# Altium footprint library PcbLib1.PcbLib: 148 footprints (part 8 of 10)
Each footprint in its own frame and in the unit in brackets; x right, y up, seen from the top. Pads: shape width x height; smd on the part's side, far side on the other; paste and mask are expansions set on the pad; w line width, h text height; cw(c..) or ccw(c..) is an arc to the next point about the centre after c.
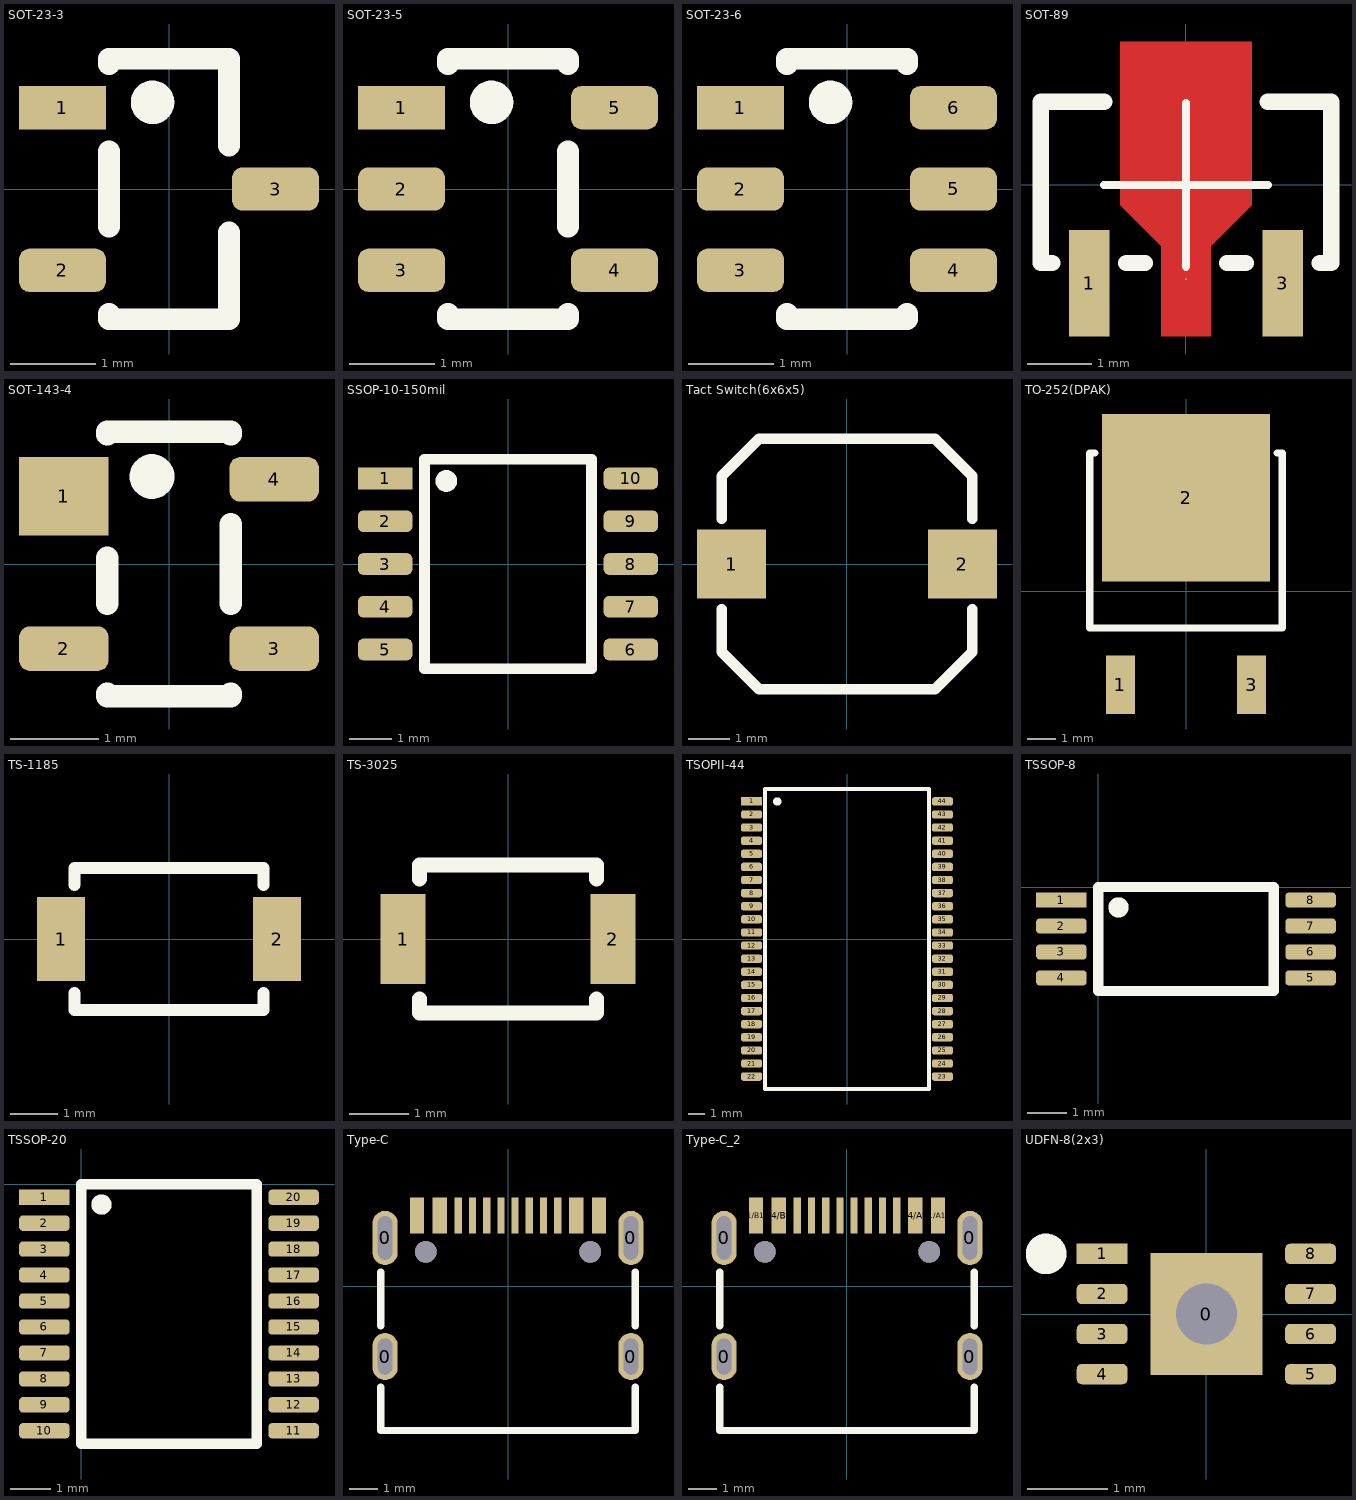
[diagram p7: the footprints below, top view; thin cyan lines are the x and y axes]

## SOT-23-3 [mil]
pads (3):
  rect 40x20 smd: 1(-48.97,37.4)
  rrect50% 40x20 smd: 2(-48.97,-37.4) 3(48.97,0)
Top Overlay:
  circle w10: c-7.56,39.84 r5
  lines w10: -27.56,-57.4 -27.56,-59.84 27.56,-59.84 27.56,-20 ; -27.56,-17.4 -27.56,17.4 ; -27.56,57.4 -27.56,59.84 27.56,59.84 27.56,20
3D body "SOT-23-3.step": height 43.7, standoff 0, extent -46.65,-57.48 46.65,57.48

## SOT-23-5 [mil]
pads (5):
  rect 40x20 smd: 1(-48.97,37.4)
  rrect50% 40x20 smd: 2(-48.97,0) 3(-48.97,-37.4) 4(48.97,-37.4) 5(48.97,37.4)
Top Overlay:
  circle w10: c-7.56,39.84 r5
  lines w10: -27.56,-57.4 -27.56,-59.84 27.56,-59.84 27.56,-57.4 ; -27.56,57.4 -27.56,59.84 27.56,59.84 27.56,57.4 ; 27.56,-17.4 27.56,17.4
3D body "SOT-23-5.step": height 57.09, standoff 0, extent -55.12,-57.09 55.12,57.09

## SOT-23-6 [mil]
pads (6):
  rect 40x20 smd: 1(-48.97,37.4)
  rrect50% 40x20 smd: 2(-48.97,0) 3(-48.97,-37.4) 4(48.97,-37.4) 5(48.97,0) 6(48.97,37.4)
Top Overlay:
  circle w10: c-7.56,39.84 r5
  lines w10: -27.56,-57.4 -27.56,-59.84 27.56,-59.84 27.56,-57.4 ; -27.56,57.4 -27.56,59.84 27.56,59.84 27.56,57.4
3D body "SOT-23-6.step": height 43.31, standoff 0, extent -54.13,-58.07 54.13,58.07

## SOT-89 [mil]
pads (3):
  rect 25x65 smd: 1(-59.06,-60) 3(59.06,-60)
  round 1 smd: 2(0,-57.5)
Top Layer:
  region: -15,-37.5 -40,-12.5 -40,87.5 40,87.5 40,-12.5 15,-37.5 15,-92.5 -15,-92.5
Top Overlay:
  lines w5: -50,0 50,0 ; 0,-50 0,50
  lines w10: -81.56,-47.66 -88.58,-47.66 -88.58,50.77 -50,50.77 ; -36.56,-47.66 -25,-47.66 ; 25,-47.66 36.56,-47.66 ; 50,50.77 88.58,50.77 88.58,-47.66 81.56,-47.66
3D body "SOT-89.step": height 55.12, standoff 0, extent -86.61,-82.28 86.61,77.17

## SOT-143-4 [mil]
pads (4):
  rect 40x35 smd: 1(-46.97,30.3)
  rrect50% 40x20 smd: 2(-46.97,-37.8) 3(46.97,-37.8) 4(46.97,37.8)
Top Overlay:
  circle w10: c-7.56,39.06 r5
  lines w10: -27.56,-57.8 -27.56,-59.06 27.56,-59.06 27.56,-57.8 ; -27.56,-17.8 -27.56,2.8 ; -27.56,57.8 -27.56,59.06 27.56,59.06 27.56,57.8 ; 27.56,-17.8 27.56,17.8
3D body "SOT-143-4.step": height 43.96, standoff -0.13, extent -46.65,-57.48 46.65,57.48

## SSOP-10-150mil [mil]
pads (10):
  rect 50x20 smd: 1(-113.11,78.74)
  rrect50% 50x20 smd: 2(-113.11,39.37) 3(-113.11,0) 4(-113.11,-39.37) 5(-113.11,-78.74) 6(113.11,-78.74) 7(113.11,-39.37) 8(113.11,0) 9(113.11,39.37) 10(113.11,78.74)
Top Overlay:
  circle w10: c-56.77,76.46 r5
  lines w10: -76.77,-96.46 76.77,-96.46 76.77,96.46 -76.77,96.46 -76.77,-96.46
3D body "SSOP-10-150mil.step": height 68.9, standoff 0, extent -118.11,-96.46 118.11,96.46

## Tact Switch(6x6x5) [mil]
pads (2):
  rect 65x65 smd: 1(-108.74,0) 2(108.74,0)
Top Overlay:
  lines w10: -118.11,-42.5 -118.11,-82.68 -82.68,-118.11 82.68,-118.11 118.11,-82.68 118.11,-42.5 ; -118.11,42.5 -118.11,82.68 -82.68,118.11 82.68,118.11 118.11,82.68 118.11,42.5
3D body "Tact Switch(6x6x5).stp": height 196.85, standoff 0, extent -130.91,-118.11 130.91,118.11

## TO-252(DPAK) [mil]
pads (3):
  rect 40x80 smd: 1(-90,-128.25) 3(90,-128.25)
  rect 230x230 smd: 2(0,128.25)
Top Overlay:
  lines w10: -125,189.7 -131.89,189.7 -131.89,-50.3 131.89,-50.3 131.89,189.7 125,189.7
3D body "TO-252(DPAK).step": height 90.16, standoff -0.39, extent -128.74,-149.32 128.74,231.32

## TS-1185 [mil] "XKB"
pads (2):
  rect 40x70 smd: 1(-90,0) 2(90,0)
Top Overlay:
  lines w10: -78.74,-45 -78.74,-59.06 78.74,-59.06 78.74,-45 ; -78.74,45 -78.74,59.06 78.74,59.06 78.74,45
3D body "TS-1185.stp": height 78.74, standoff 0, extent -98.43,-59.06 98.43,59.06

## TS-3025 [mil] "XKB"
pads (2):
  rect 30x60 smd: 1(-70,0) 2(70,0)
Top Overlay:
  lines w10: -59.06,-40 -59.06,-49.21 59.06,-49.21 59.06,-40 ; -59.06,40 -59.06,49.21 59.06,49.21 59.06,40
3D body "TS-3025.stp": height 59.06, standoff 0, extent -78.74,-49.21 78.74,49.21

## TSOPII-44 [mil]
pads (44):
  rect 50x20 smd: 1(-229.43,330.71)
  rrect50% 50x20 smd: 2(-229.43,299.21) 3(-229.43,267.72) 4(-229.43,236.22) 5(-229.43,204.72) 6(-229.43,173.23) 7(-229.43,141.73) 8(-229.43,110.24) 9(-229.43,78.74) 10(-229.43,47.24) 11(-229.43,15.75) 12(-229.43,-15.75) 13(-229.43,-47.24) 14(-229.43,-78.74) 15(-229.43,-110.24) 16(-229.43,-141.73) 17(-229.43,-173.23) 18(-229.43,-204.72) 19(-229.43,-236.22) 20(-229.43,-267.72) 21(-229.43,-299.21) 22(-229.43,-330.71) 23(229.43,-330.71) 24(229.43,-299.21) 25(229.43,-267.72) 26(229.43,-236.22) 27(229.43,-204.72) 28(229.43,-173.23) 29(229.43,-141.73) 30(229.43,-110.24) 31(229.43,-78.74) 32(229.43,-47.24) 33(229.43,-15.75) 34(229.43,15.75) 35(229.43,47.24) 36(229.43,78.74) 37(229.43,110.24) 38(229.43,141.73) 39(229.43,173.23) 40(229.43,204.72) 41(229.43,236.22) 42(229.43,267.72) 43(229.43,299.21) 44(229.43,330.71)
Top Overlay:
  circle w10: c-167.44,330.43 r5
  lines w10: -197.44,-360.43 -197.44,360.43 197.44,360.43 197.44,-360.43 -197.44,-360.43
3D body "TSOPII-44.step": height 47.09, standoff 0, extent -235,-364.49 235,364.49

## TSSOP-8 [mil]
pads (8):
  rect 50x15 smd: 1(-36.34,-12.8)
  rrect50% 50x15 smd: 2(-36.34,-38.39) 3(-36.34,-63.98) 4(-36.34,-89.57) 5(209.57,-89.57) 6(209.57,-63.98) 7(209.57,-38.39) 8(209.57,-12.8)
Top Overlay:
  circle w10: c20,-20 r5
  lines w10: 0,-102.36 173.23,-102.36 173.23,0 0,0 0,-102.36

## TSSOP-20 [mil]
pads (20):
  rect 50x15 smd: 1(-36.34,-12.8)
  rrect50% 50x15 smd: 2(-36.34,-38.39) 3(-36.34,-63.98) 4(-36.34,-89.57) 5(-36.34,-115.16) 6(-36.34,-140.75) 7(-36.34,-166.34) 8(-36.34,-191.93) 9(-36.34,-217.52) 10(-36.34,-243.11) 11(209.57,-243.11) 12(209.57,-217.52) 13(209.57,-191.93) 14(209.57,-166.34) 15(209.57,-140.75) 16(209.57,-115.16) 17(209.57,-89.57) 18(209.57,-63.98) 19(209.57,-38.39) 20(209.57,-12.8)
Top Overlay:
  circle w10: c20,-20 r5
  lines w10: 0,-255.91 173.23,-255.91 173.23,0 0,0 0,-255.91
3D body "TSSOP-20.step": height 47.24, standoff 0, extent -39.37,-255.91 212.6,0

## Type-C [mil]
pads (22):
  oval 35x65 hole 20 slot 50 at 90 deg: 0(-170.08,-97.56) 0(170.08,-97.56)
  oval 35x75 hole 20 slot 60 at 90 deg: 0(-170.08,66.61) 0(170.08,66.61)
  rect 10x50 smd: A1(-130.91,97.56) A4(-99.41,97.56) A5(-49.21,97.56) A6(-9.84,97.56) A7(9.84,97.56) A8(49.21,97.56) A9(99.41,97.56) A12(130.91,97.56) B1(121.06,97.56) B4(89.57,97.56) B5(68.9,97.56) B6(29.53,97.56) B7(-29.53,97.56) B8(-68.9,97.56) B9(-89.57,97.56) B12(-121.06,97.56)
  round 30 hole 30 unplated: ""(-113.78,47.32) ""(113.78,47.32)
Top Overlay:
  lines w10: -175.98,-140.06 -175.98,-199.92 175.98,-199.92 175.98,-140.06 ; -175.98,-55.06 -175.98,19.11 ; 175.98,-55.06 175.98,19.11
3D body "Type_C.stp": height 128.4, standoff -39.31, extent -176,-199.56 175.97,105.56

## Type-C_2 [mil]
pads (18):
  oval 35x65 hole 20 slot 50 at 90 deg: 0(-170.08,-97.56) 0(170.08,-97.56)
  oval 35x75 hole 20 slot 60 at 90 deg: 0(-170.08,66.61) 0(170.08,66.61)
  rect 20x50 smd: A1/B12(-125.91,97.56) A4/B9(-94.41,97.56) B1/A12(125.91,97.56) B4/A9(94.41,97.56)
  rect 10x50 smd: A5(-49.21,97.56) A6(-9.84,97.56) A7(9.84,97.56) A8(49.21,97.56) B5(68.9,97.56) B6(29.53,97.56) B7(-29.53,97.56) B8(-68.9,97.56)
  round 30 hole 30 unplated: ""(-113.78,47.32) ""(113.78,47.32)
Top Overlay:
  lines w10: -175.98,-140.06 -175.98,-199.92 175.98,-199.92 175.98,-140.06 ; -175.98,-55.06 -175.98,19.11 ; 175.98,-55.06 175.98,19.11
3D body "Type_C.stp": height 128.4, standoff -39.31, extent -176,-199.56 175.97,105.56

## UDFN-8(2x3) [mm]
pads (9):
  rect 1.397x1.524 smd: 0(0,0)
  rect 0.635x0.254 smd: 1(-1.3,0.75)
  rrect50% 0.635x0.254 smd: 2(-1.3,0.25) 3(-1.3,-0.25) 4(-1.3,-0.75) 5(1.3,-0.75) 6(1.3,-0.25) 7(1.3,0.25) 8(1.3,0.75)
via 0,0 diameter 1.016 hole 0.762
Top Overlay:
  circle w0.254: c-1.998,0.75 r0.127
3D body "UDFN-8(2x3).stp": height 0.75, standoff 0, extent -1.5,-1 1.5,1